# Altium integrated library Samtec 2 mm Pitch Terminal Strips.IntLib: 623 symbols (part 3 of 5) (continued)
## TSH-110-01-L-DH-SL (continued)

## TSH-110-01-L-DV-A
designator P?
Shrouded Header, Surface Mount, Vertical, -55 to 125 degC, 2 mm Pitch, 20-Pin, Male, RoHS; Manufacturer: Samtec; PartNumber: TSH-110-01-L-DV-A; Pitch: 2 mm; DatasheetVersion: F-214; PackageVersion: R, 7/2010; PackageReference: TSH-110-01-X-DV-A; PackageDescription: 2mm End Shroud Terminal Assembly; Supplier 1: Newark; Supplier Part Number 1: 77P3936; Orientation: Vertical; RoHS: True; Temperature Range: -55 to 125 degC; Mounting Technology: Surface Mount; ComponentLink1Description: Manufacturer URL; ComponentLink1URL: http://www.samtec.com; ComponentLink2Description: Datasheet; ComponentLink2URL: http://d2a072wq521u33.cloudfront.net/catalog_english//TSH.PDF; ComponentLink3Description: Package Specification; ComponentLink3URL: http://www.samtec.com/documents/webfiles/cpdf/TSH-1XX-XX-XX-DX-XX-MKT.pdf
footprint SMTC-TSH-110-01-X-DV-A (Shroud Terminal Assembly, 2x10 Pins, Vertical, 2mm Pitch, Male)
pins: 1, 2, 3, 4, 5, 6, 7, 8, 9, 10, 11, 12, 13, 14, 15, 16, 17, 18, 19, 20

## TSH-110-01-T-DH-SL
designator P?
Shrouded Header, Surface Mount, Horizontal, -55 to 105 degC, 2 mm Pitch, 20-Pin, Male, RoHS; Manufacturer: Samtec; PartNumber: TSH-110-01-T-DH-SL; Pitch: 2 mm; DatasheetVersion: F-214; PackageVersion: W, 9/1999; PackageReference: TSH-110-01-X-DH-SL; PackageDescription: 2mm Horizontal Mount Terminal Strip Assembly; Supplier 1: Newark; Supplier Part Number 1: 77P3983; Orientation: Horizontal; RoHS: True; Temperature Range: -55 to 105 degC; Mounting Technology: Surface Mount; ComponentLink1Description: Manufacturer URL; ComponentLink1URL: http://www.samtec.com; ComponentLink2Description: Datasheet; ComponentLink2URL: http://d2a072wq521u33.cloudfront.net/catalog_english//TSH.PDF; ComponentLink3Description: Package Specification; ComponentLink3URL: http://www.samtec.com/documents/webfiles/cpdf/TSH-1XX-XX-XX-XX-XX-MKT.pdf
footprint SMTC-TSH-110-01-X-DH-SL (Terminal Strip Assembly, 2x10 Pins, Horizontal, 2mm Pitch, Male)
pins: 1, 2, 3, 4, 5, 6, 7, 8, 9, 10, 11, 12, 13, 14, 15, 16, 17, 18, 19, 20, MH1, MH2

## TSH-110-01-T-DV-A
designator P?
Shrouded Header, Surface Mount, Vertical, -55 to 105 degC, 2 mm Pitch, 20-Pin, Male, RoHS; Manufacturer: Samtec; PartNumber: TSH-110-01-T-DV-A; Pitch: 2 mm; DatasheetVersion: F-214; PackageVersion: R, 7/2010; PackageReference: TSH-110-01-X-DV-A; PackageDescription: 2mm End Shroud Terminal Assembly; Supplier 1: Newark; Supplier Part Number 1: 77P3986; Orientation: Vertical; RoHS: True; Temperature Range: -55 to 105 degC; Mounting Technology: Surface Mount; ComponentLink1Description: Manufacturer URL; ComponentLink1URL: http://www.samtec.com; ComponentLink2Description: Datasheet; ComponentLink2URL: http://d2a072wq521u33.cloudfront.net/catalog_english//TSH.PDF; ComponentLink3Description: Package Specification; ComponentLink3URL: http://www.samtec.com/documents/webfiles/cpdf/TSH-1XX-XX-XX-DX-XX-MKT.pdf
footprint SMTC-TSH-110-01-X-DV-A (Shroud Terminal Assembly, 2x10 Pins, Vertical, 2mm Pitch, Male)
pins: 1, 2, 3, 4, 5, 6, 7, 8, 9, 10, 11, 12, 13, 14, 15, 16, 17, 18, 19, 20

## TSH-120-01-F-DV-A-M
designator P?
Shrouded Header, Surface Mount, Vertical, -55 to 125 degC, 2 mm Pitch, 40-Pin, Male, RoHS; Manufacturer: Samtec; PartNumber: TSH-120-01-F-DV-A-M; Pitch: 2 mm; DatasheetVersion: F-214; PackageVersion: R, 7/2010; PackageReference: TSH-120-01-X-DV-A-M; PackageDescription: 2mm End Shroud Terminal Assembly; Orientation: Vertical; RoHS: True; Temperature Range: -55 to 125 degC; Mounting Technology: Surface Mount; ComponentLink1Description: Manufacturer URL; ComponentLink1URL: http://www.samtec.com; ComponentLink2Description: Datasheet; ComponentLink2URL: http://d2a072wq521u33.cloudfront.net/catalog_english//TSH.PDF; ComponentLink3Description: Package Specification; ComponentLink3URL: http://www.samtec.com/documents/webfiles/cpdf/TSH-1XX-XX-XX-DX-XX-MKT.pdf
footprint SMTC-TSH-120-01-X-DV-A-M (Shroud Terminal Assembly, 2x20 Pins, Vertical, 2mm Pitch, Male)
pins: 1, 2, 3, 4, 5, 6, 7, 8, 9, 10, 11, 12, 13, 14, 15, 16, 17, 18, 19, 20, 21, 22, 23, 24, 25, 26, 27, 28, 29, 30, 31, 32, 33, 34, 35, 36, 37, 38, 39, 40

## TSH-120-01-L-DV-A-M
designator P?
Shrouded Header, Surface Mount, Vertical, -55 to 125 degC, 2 mm Pitch, 40-Pin, Male, RoHS; Manufacturer: Samtec; PartNumber: TSH-120-01-L-DV-A-M; Pitch: 2 mm; DatasheetVersion: F-214; PackageVersion: R, 7/2010; PackageReference: TSH-120-01-X-DV-A-M; PackageDescription: 2mm End Shroud Terminal Assembly; Orientation: Vertical; RoHS: True; Temperature Range: -55 to 125 degC; Mounting Technology: Surface Mount; ComponentLink1Description: Manufacturer URL; ComponentLink1URL: http://www.samtec.com; ComponentLink2Description: Datasheet; ComponentLink2URL: http://d2a072wq521u33.cloudfront.net/catalog_english//TSH.PDF; ComponentLink3Description: Package Specification; ComponentLink3URL: http://www.samtec.com/documents/webfiles/cpdf/TSH-1XX-XX-XX-DX-XX-MKT.pdf
footprint SMTC-TSH-120-01-X-DV-A-M (Shroud Terminal Assembly, 2x20 Pins, Vertical, 2mm Pitch, Male)
pins: 1, 2, 3, 4, 5, 6, 7, 8, 9, 10, 11, 12, 13, 14, 15, 16, 17, 18, 19, 20, 21, 22, 23, 24, 25, 26, 27, 28, 29, 30, 31, 32, 33, 34, 35, 36, 37, 38, 39, 40

## TSH-120-01-T-DV-A-M
designator P?
Shrouded Header, Surface Mount, Vertical, -55 to 105 degC, 2 mm Pitch, 40-Pin, Male, RoHS; Manufacturer: Samtec; PartNumber: TSH-120-01-T-DV-A-M; Pitch: 2 mm; DatasheetVersion: F-214; PackageVersion: R, 7/2010; PackageReference: TSH-120-01-X-DV-A-M; PackageDescription: 2mm End Shroud Terminal Assembly; Orientation: Vertical; RoHS: True; Temperature Range: -55 to 105 degC; Mounting Technology: Surface Mount; ComponentLink1Description: Manufacturer URL; ComponentLink1URL: http://www.samtec.com; ComponentLink2Description: Datasheet; ComponentLink2URL: http://d2a072wq521u33.cloudfront.net/catalog_english//TSH.PDF; ComponentLink3Description: Package Specification; ComponentLink3URL: http://www.samtec.com/documents/webfiles/cpdf/TSH-1XX-XX-XX-DX-XX-MKT.pdf
footprint SMTC-TSH-120-01-X-DV-A-M (Shroud Terminal Assembly, 2x20 Pins, Vertical, 2mm Pitch, Male)
pins: 1, 2, 3, 4, 5, 6, 7, 8, 9, 10, 11, 12, 13, 14, 15, 16, 17, 18, 19, 20, 21, 22, 23, 24, 25, 26, 27, 28, 29, 30, 31, 32, 33, 34, 35, 36, 37, 38, 39, 40

## TSH-130-01-F-DH-SL
designator P?
Shrouded Header, Surface Mount, Horizontal, -55 to 125 degC, 2 mm Pitch, 60-Pin, Male, RoHS; Manufacturer: Samtec; PartNumber: TSH-130-01-F-DH-SL; Pitch: 2 mm; DatasheetVersion: F-214; PackageVersion: W, 9/1999; PackageReference: TSH-130-01-X-DH-SL; PackageDescription: 2mm Horizontal Mount Terminal Strip Assembly; Supplier 1: Newark; Supplier Part Number 1: 77P4351; Orientation: Horizontal; RoHS: True; Temperature Range: -55 to 125 degC; Mounting Technology: Surface Mount; ComponentLink1Description: Manufacturer URL; ComponentLink1URL: http://www.samtec.com; ComponentLink2Description: Datasheet; ComponentLink2URL: http://d2a072wq521u33.cloudfront.net/catalog_english//TSH.PDF; ComponentLink3Description: Package Specification; ComponentLink3URL: http://www.samtec.com/documents/webfiles/cpdf/TSH-1XX-XX-XX-XX-XX-MKT.pdf
footprint SMTC-TSH-130-01-X-DH-SL (Terminal Strip Assembly, 2x30 Pins, Horizontal, 2mm Pitch, Male)
pins: 1, 2, 3, 4, 5, 6, 7, 8, 9, 10, 11, 12, 13, 14, 15, 16, 17, 18, 19, 20, 21, 22, 23, 24, 25, 26, 27, 28, 29, 30, 31, 32, 33, 34, 35, 36, 37, 38, 39, 40, 41, 42, 43, 44, 45, 46, 47, 48, 49, 50, 51, 52, 53, 54, 55, 56, 57, 58, 59, 60, MH1, MH2

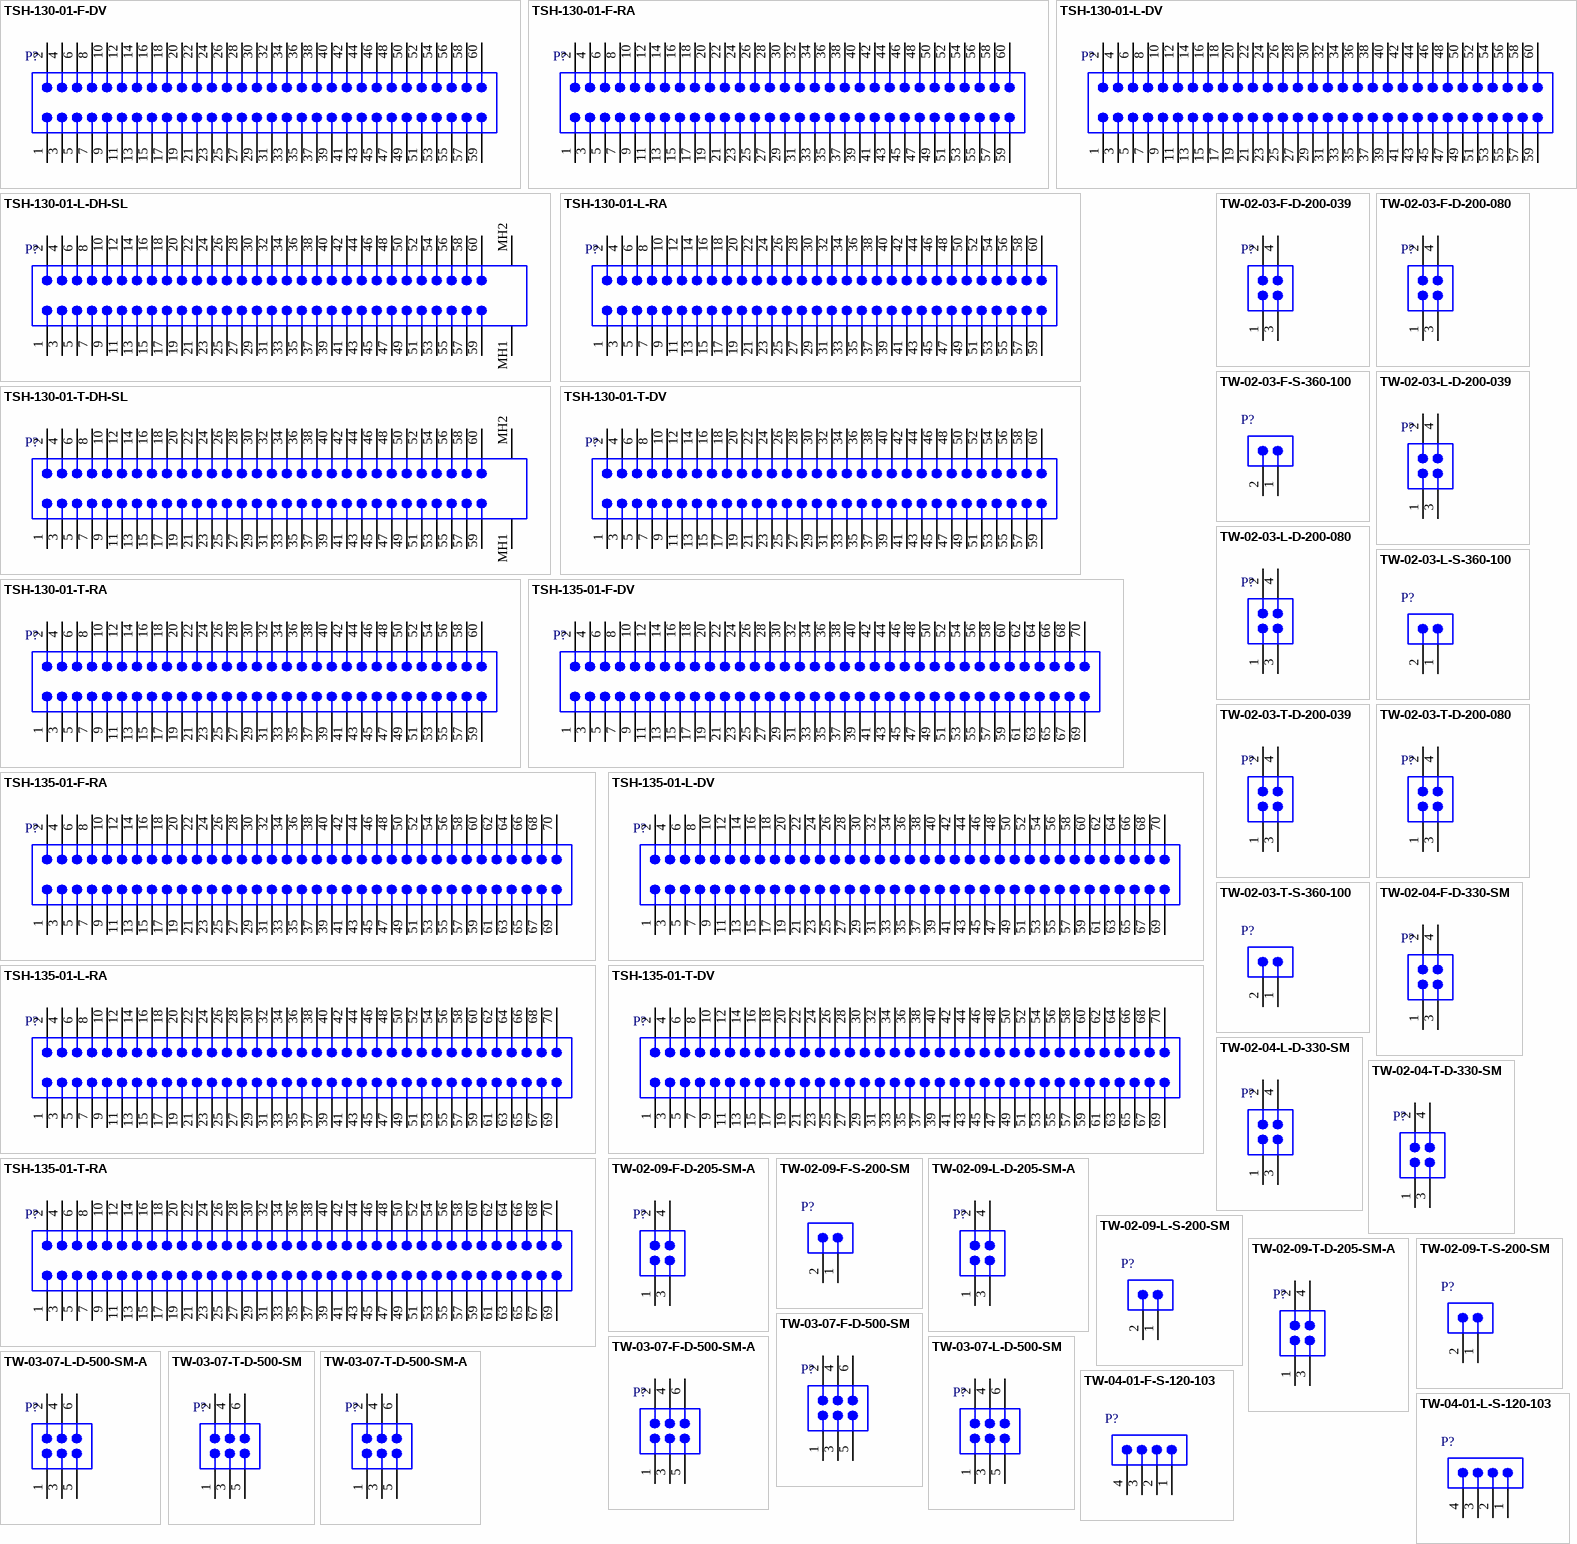
[diagram p9: symbols TSH-130-01-F-DV to TW-04-01-L-S-120-103]

## TSH-130-01-F-DV
designator P?
Shrouded Header, Surface Mount, Vertical, -55 to 125 degC, 2 mm Pitch, 60-Pin, Male, RoHS; Manufacturer: Samtec; PartNumber: TSH-130-01-F-DV; Pitch: 2 mm; DatasheetVersion: F-214; PackageVersion: R, 7/2010; PackageReference: TSH-130-01-X-DV; PackageDescription: 2mm End Shroud Terminal Assembly; Supplier 1: Newark; Supplier Part Number 1: 77P4353; Orientation: Vertical; RoHS: True; Temperature Range: -55 to 125 degC; Mounting Technology: Surface Mount; ComponentLink1Description: Manufacturer URL; ComponentLink1URL: http://www.samtec.com; ComponentLink2Description: Datasheet; ComponentLink2URL: http://d2a072wq521u33.cloudfront.net/catalog_english//TSH.PDF; ComponentLink3Description: Package Specification; ComponentLink3URL: http://www.samtec.com/documents/webfiles/cpdf/TSH-1XX-XX-XX-DX-XX-MKT.pdf
footprint SMTC-TSH-130-01-X-DV (Shroud Terminal Assembly, 2x30 Pins, Vertical, 2mm Pitch, Male)
pins: 1, 2, 3, 4, 5, 6, 7, 8, 9, 10, 11, 12, 13, 14, 15, 16, 17, 18, 19, 20, 21, 22, 23, 24, 25, 26, 27, 28, 29, 30, 31, 32, 33, 34, 35, 36, 37, 38, 39, 40, 41, 42, 43, 44, 45, 46, 47, 48, 49, 50, 51, 52, 53, 54, 55, 56, 57, 58, 59, 60

## TSH-130-01-F-RA
designator P?
Shrouded Header, Through-Hole, Right Angle, -55 to 125 degC, 2 mm Pitch, 60-Pin, Male, RoHS; Manufacturer: Samtec; PartNumber: TSH-130-01-F-RA; Pitch: 2 mm; DatasheetVersion: F-214; PackageVersion: W, 9/1999; PackageReference: TSH-130-01-X-RA; PackageDescription: 2mm Horizontal Mount Terminal Strip Assembly; Supplier 1: Newark; Supplier Part Number 1: 77P4357; Orientation: Right Angle; RoHS: True; Temperature Range: -55 to 125 degC; Mounting Technology: Through-hole; ComponentLink1Description: Manufacturer URL; ComponentLink1URL: http://www.samtec.com; ComponentLink2Description: Datasheet; ComponentLink2URL: http://d2a072wq521u33.cloudfront.net/catalog_english//TSH.PDF; ComponentLink3Description: Package Specification; ComponentLink3URL: http://www.samtec.com/documents/webfiles/cpdf/TSH-1XX-XX-XX-XX-XX-MKT.pdf
footprint SMTC-TSH-130-01-X-RA (Terminal Strip Assembly, 2x30 Pins, Right Angle, 2mm Pitch, Male)
pins: 1, 2, 3, 4, 5, 6, 7, 8, 9, 10, 11, 12, 13, 14, 15, 16, 17, 18, 19, 20, 21, 22, 23, 24, 25, 26, 27, 28, 29, 30, 31, 32, 33, 34, 35, 36, 37, 38, 39, 40, 41, 42, 43, 44, 45, 46, 47, 48, 49, 50, 51, 52, 53, 54, 55, 56, 57, 58, 59, 60

## TSH-130-01-L-DH-SL
designator P?
Shrouded Header, Surface Mount, Horizontal, -55 to 125 degC, 2 mm Pitch, 60-Pin, Male, RoHS; Manufacturer: Samtec; PartNumber: TSH-130-01-L-DH-SL; Pitch: 2 mm; DatasheetVersion: F-214; PackageVersion: W, 9/1999; PackageReference: TSH-130-01-X-DH-SL; PackageDescription: 2mm Horizontal Mount Terminal Strip Assembly; Supplier 1: Newark; Supplier Part Number 1: 77P4362; Orientation: Horizontal; RoHS: True; Temperature Range: -55 to 125 degC; Mounting Technology: Surface Mount; ComponentLink1Description: Manufacturer URL; ComponentLink1URL: http://www.samtec.com; ComponentLink2Description: Datasheet; ComponentLink2URL: http://d2a072wq521u33.cloudfront.net/catalog_english//TSH.PDF; ComponentLink3Description: Package Specification; ComponentLink3URL: http://www.samtec.com/documents/webfiles/cpdf/TSH-1XX-XX-XX-XX-XX-MKT.pdf
footprint SMTC-TSH-130-01-X-DH-SL (Terminal Strip Assembly, 2x30 Pins, Horizontal, 2mm Pitch, Male)
pins: 1, 2, 3, 4, 5, 6, 7, 8, 9, 10, 11, 12, 13, 14, 15, 16, 17, 18, 19, 20, 21, 22, 23, 24, 25, 26, 27, 28, 29, 30, 31, 32, 33, 34, 35, 36, 37, 38, 39, 40, 41, 42, 43, 44, 45, 46, 47, 48, 49, 50, 51, 52, 53, 54, 55, 56, 57, 58, 59, 60, MH1, MH2

## TSH-130-01-L-DV
designator P?
Shrouded Header, Surface Mount, Vertical, -55 to 125 degC, 2 mm Pitch, 60-Pin, Male, RoHS; Manufacturer: Samtec; PartNumber: TSH-130-01-L-DV; Pitch: 2 mm; DatasheetVersion: F-214; PackageVersion: R, 7/2010; PackageReference: TSH-130-01-X-DV; PackageDescription: 2mm End Shroud Terminal Assembly; Supplier 1: Newark; Supplier Part Number 1: 77P4364; Orientation: Vertical; RoHS: True; Temperature Range: -55 to 125 degC; Mounting Technology: Surface Mount; ComponentLink1Description: Manufacturer URL; ComponentLink1URL: http://www.samtec.com; ComponentLink2Description: Datasheet; ComponentLink2URL: http://d2a072wq521u33.cloudfront.net/catalog_english//TSH.PDF; ComponentLink3Description: Package Specification; ComponentLink3URL: http://www.samtec.com/documents/webfiles/cpdf/TSH-1XX-XX-XX-DX-XX-MKT.pdf
footprint SMTC-TSH-130-01-X-DV (Shroud Terminal Assembly, 2x30 Pins, Vertical, 2mm Pitch, Male)
pins: 1, 2, 3, 4, 5, 6, 7, 8, 9, 10, 11, 12, 13, 14, 15, 16, 17, 18, 19, 20, 21, 22, 23, 24, 25, 26, 27, 28, 29, 30, 31, 32, 33, 34, 35, 36, 37, 38, 39, 40, 41, 42, 43, 44, 45, 46, 47, 48, 49, 50, 51, 52, 53, 54, 55, 56, 57, 58, 59, 60

## TSH-130-01-L-RA
designator P?
Shrouded Header, Through-Hole, Right Angle, -55 to 125 degC, 2 mm Pitch, 60-Pin, Male, RoHS; Manufacturer: Samtec; PartNumber: TSH-130-01-L-RA; Pitch: 2 mm; DatasheetVersion: F-214; PackageVersion: W, 9/1999; PackageReference: TSH-130-01-X-RA; PackageDescription: 2mm Horizontal Mount Terminal Strip Assembly; Supplier 1: Newark; Supplier Part Number 1: 77P4367; Orientation: Right Angle; RoHS: True; Temperature Range: -55 to 125 degC; Mounting Technology: Through-hole; ComponentLink1Description: Manufacturer URL; ComponentLink1URL: http://www.samtec.com; ComponentLink2Description: Datasheet; ComponentLink2URL: http://d2a072wq521u33.cloudfront.net/catalog_english//TSH.PDF; ComponentLink3Description: Package Specification; ComponentLink3URL: http://www.samtec.com/documents/webfiles/cpdf/TSH-1XX-XX-XX-XX-XX-MKT.pdf
footprint SMTC-TSH-130-01-X-RA (Terminal Strip Assembly, 2x30 Pins, Right Angle, 2mm Pitch, Male)
pins: 1, 2, 3, 4, 5, 6, 7, 8, 9, 10, 11, 12, 13, 14, 15, 16, 17, 18, 19, 20, 21, 22, 23, 24, 25, 26, 27, 28, 29, 30, 31, 32, 33, 34, 35, 36, 37, 38, 39, 40, 41, 42, 43, 44, 45, 46, 47, 48, 49, 50, 51, 52, 53, 54, 55, 56, 57, 58, 59, 60

## TSH-130-01-T-DH-SL
designator P?
Shrouded Header, Surface Mount, Horizontal, -55 to 105 degC, 2 mm Pitch, 60-Pin, Male, RoHS; Manufacturer: Samtec; PartNumber: TSH-130-01-T-DH-SL; Pitch: 2 mm; DatasheetVersion: F-214; PackageVersion: W, 9/1999; PackageReference: TSH-130-01-X-DH-SL; PackageDescription: 2mm Horizontal Mount Terminal Strip Assembly; Supplier 1: Newark; Supplier Part Number 1: 77P4379; Orientation: Horizontal; RoHS: True; Temperature Range: -55 to 105 degC; Mounting Technology: Surface Mount; ComponentLink1Description: Manufacturer URL; ComponentLink1URL: http://www.samtec.com; ComponentLink2Description: Datasheet; ComponentLink2URL: http://d2a072wq521u33.cloudfront.net/catalog_english//TSH.PDF; ComponentLink3Description: Package Specification; ComponentLink3URL: http://www.samtec.com/documents/webfiles/cpdf/TSH-1XX-XX-XX-XX-XX-MKT.pdf
footprint SMTC-TSH-130-01-X-DH-SL (Terminal Strip Assembly, 2x30 Pins, Horizontal, 2mm Pitch, Male)
pins: 1, 2, 3, 4, 5, 6, 7, 8, 9, 10, 11, 12, 13, 14, 15, 16, 17, 18, 19, 20, 21, 22, 23, 24, 25, 26, 27, 28, 29, 30, 31, 32, 33, 34, 35, 36, 37, 38, 39, 40, 41, 42, 43, 44, 45, 46, 47, 48, 49, 50, 51, 52, 53, 54, 55, 56, 57, 58, 59, 60, MH1, MH2

## TSH-130-01-T-DV
designator P?
Shrouded Header, Surface Mount, Vertical, -55 to 105 degC, 2 mm Pitch, 60-Pin, Male, RoHS; Manufacturer: Samtec; PartNumber: TSH-130-01-T-DV; Pitch: 2 mm; DatasheetVersion: F-214; PackageVersion: R, 7/2010; PackageReference: TSH-130-01-X-DV; PackageDescription: 2mm End Shroud Terminal Assembly; Orientation: Vertical; RoHS: True; Temperature Range: -55 to 105 degC; Mounting Technology: Surface Mount; ComponentLink1Description: Manufacturer URL; ComponentLink1URL: http://www.samtec.com; ComponentLink2Description: Datasheet; ComponentLink2URL: http://d2a072wq521u33.cloudfront.net/catalog_english//TSH.PDF; ComponentLink3Description: Package Specification; ComponentLink3URL: http://www.samtec.com/documents/webfiles/cpdf/TSH-1XX-XX-XX-DX-XX-MKT.pdf
footprint SMTC-TSH-130-01-X-DV (Shroud Terminal Assembly, 2x30 Pins, Vertical, 2mm Pitch, Male)
pins: 1, 2, 3, 4, 5, 6, 7, 8, 9, 10, 11, 12, 13, 14, 15, 16, 17, 18, 19, 20, 21, 22, 23, 24, 25, 26, 27, 28, 29, 30, 31, 32, 33, 34, 35, 36, 37, 38, 39, 40, 41, 42, 43, 44, 45, 46, 47, 48, 49, 50, 51, 52, 53, 54, 55, 56, 57, 58, 59, 60

## TSH-130-01-T-RA
designator P?
Shrouded Header, Through-Hole, Right Angle, -55 to 105 degC, 2 mm Pitch, 60-Pin, Male, RoHS; Manufacturer: Samtec; PartNumber: TSH-130-01-T-RA; Pitch: 2 mm; DatasheetVersion: F-214; PackageVersion: W, 9/1999; PackageReference: TSH-130-01-X-RA; PackageDescription: 2mm Horizontal Mount Terminal Strip Assembly; Supplier 1: Newark; Supplier Part Number 1: 77P4383; Orientation: Right Angle; RoHS: True; Temperature Range: -55 to 105 degC; Mounting Technology: Through-hole; ComponentLink1Description: Manufacturer URL; ComponentLink1URL: http://www.samtec.com; ComponentLink2Description: Datasheet; ComponentLink2URL: http://d2a072wq521u33.cloudfront.net/catalog_english//TSH.PDF; ComponentLink3Description: Package Specification; ComponentLink3URL: http://www.samtec.com/documents/webfiles/cpdf/TSH-1XX-XX-XX-XX-XX-MKT.pdf
footprint SMTC-TSH-130-01-X-RA (Terminal Strip Assembly, 2x30 Pins, Right Angle, 2mm Pitch, Male)
pins: 1, 2, 3, 4, 5, 6, 7, 8, 9, 10, 11, 12, 13, 14, 15, 16, 17, 18, 19, 20, 21, 22, 23, 24, 25, 26, 27, 28, 29, 30, 31, 32, 33, 34, 35, 36, 37, 38, 39, 40, 41, 42, 43, 44, 45, 46, 47, 48, 49, 50, 51, 52, 53, 54, 55, 56, 57, 58, 59, 60

## TSH-135-01-F-DV
designator P?
Shrouded Header, Surface Mount, Vertical, -55 to 125 degC, 2 mm Pitch, 70-Pin, Male, RoHS; Manufacturer: Samtec; PartNumber: TSH-135-01-F-DV; Pitch: 2 mm; DatasheetVersion: F-214; PackageVersion: R, 7/2010; PackageReference: TSH-135-01-X-DV; PackageDescription: 2mm End Shroud Terminal Assembly; Orientation: Vertical; RoHS: True; Temperature Range: -55 to 125 degC; Mounting Technology: Surface Mount; ComponentLink1Description: Manufacturer URL; ComponentLink1URL: http://www.samtec.com; ComponentLink2Description: Datasheet; ComponentLink2URL: http://d2a072wq521u33.cloudfront.net/catalog_english//TSH.PDF; ComponentLink3Description: Package Specification; ComponentLink3URL: http://www.samtec.com/documents/webfiles/cpdf/TSH-1XX-XX-XX-DX-XX-MKT.pdf
footprint SMTC-TSH-135-01-X-DV (Shroud Terminal Assembly, 2x35 Pins, Vertical, 2mm Pitch, Male)
pins: 1, 2, 3, 4, 5, 6, 7, 8, 9, 10, 11, 12, 13, 14, 15, 16, 17, 18, 19, 20, 21, 22, 23, 24, 25, 26, 27, 28, 29, 30, 31, 32, 33, 34, 35, 36, 37, 38, 39, 40, 41, 42, 43, 44, 45, 46, 47, 48, 49, 50, 51, 52, 53, 54, 55, 56, 57, 58, 59, 60, 61, 62, 63, 64, 65, 66, 67, 68, 69, 70

## TSH-135-01-F-RA
designator P?
Shrouded Header, Through-Hole, Right Angle, -55 to 125 degC, 2 mm Pitch, 70-Pin, Male, RoHS; Manufacturer: Samtec; PartNumber: TSH-135-01-F-RA; Pitch: 2 mm; DatasheetVersion: F-214; PackageVersion: W, 9/1999; PackageReference: TSH-135-01-X-RA; PackageDescription: 2mm Horizontal Mount Terminal Strip Assembly; Supplier 1: Newark; Supplier Part Number 1: 77P4395; Orientation: Right Angle; RoHS: True; Temperature Range: -55 to 125 degC; Mounting Technology: Through-hole; ComponentLink1Description: Manufacturer URL; ComponentLink1URL: http://www.samtec.com; ComponentLink2Description: Datasheet; ComponentLink2URL: http://d2a072wq521u33.cloudfront.net/catalog_english//TSH.PDF; ComponentLink3Description: Package Specification; ComponentLink3URL: http://www.samtec.com/documents/webfiles/cpdf/TSH-1XX-XX-XX-XX-XX-MKT.pdf
footprint SMTC-TSH-135-01-X-RA (Terminal Strip Assembly, 2x35 Pins, Right Angle, 2mm Pitch, Male)
pins: 1, 2, 3, 4, 5, 6, 7, 8, 9, 10, 11, 12, 13, 14, 15, 16, 17, 18, 19, 20, 21, 22, 23, 24, 25, 26, 27, 28, 29, 30, 31, 32, 33, 34, 35, 36, 37, 38, 39, 40, 41, 42, 43, 44, 45, 46, 47, 48, 49, 50, 51, 52, 53, 54, 55, 56, 57, 58, 59, 60, 61, 62, 63, 64, 65, 66, 67, 68, 69, 70

## TSH-135-01-L-DV
designator P?
Shrouded Header, Surface Mount, Vertical, -55 to 125 degC, 2 mm Pitch, 70-Pin, Male, RoHS; Manufacturer: Samtec; PartNumber: TSH-135-01-L-DV; Pitch: 2 mm; DatasheetVersion: F-214; PackageVersion: R, 7/2010; PackageReference: TSH-135-01-X-DV; PackageDescription: 2mm End Shroud Terminal Assembly; Supplier 1: Newark; Supplier Part Number 1: 77P4400; Orientation: Vertical; RoHS: True; Temperature Range: -55 to 125 degC; Mounting Technology: Surface Mount; ComponentLink1Description: Manufacturer URL; ComponentLink1URL: http://www.samtec.com; ComponentLink2Description: Datasheet; ComponentLink2URL: http://d2a072wq521u33.cloudfront.net/catalog_english//TSH.PDF; ComponentLink3Description: Package Specification; ComponentLink3URL: http://www.samtec.com/documents/webfiles/cpdf/TSH-1XX-XX-XX-DX-XX-MKT.pdf
footprint SMTC-TSH-135-01-X-DV (Shroud Terminal Assembly, 2x35 Pins, Vertical, 2mm Pitch, Male)
pins: 1, 2, 3, 4, 5, 6, 7, 8, 9, 10, 11, 12, 13, 14, 15, 16, 17, 18, 19, 20, 21, 22, 23, 24, 25, 26, 27, 28, 29, 30, 31, 32, 33, 34, 35, 36, 37, 38, 39, 40, 41, 42, 43, 44, 45, 46, 47, 48, 49, 50, 51, 52, 53, 54, 55, 56, 57, 58, 59, 60, 61, 62, 63, 64, 65, 66, 67, 68, 69, 70

## TSH-135-01-L-RA
designator P?
Shrouded Header, Through-Hole, Right Angle, -55 to 125 degC, 2 mm Pitch, 70-Pin, Male, RoHS; Manufacturer: Samtec; PartNumber: TSH-135-01-L-RA; Pitch: 2 mm; DatasheetVersion: F-214; PackageVersion: W, 9/1999; PackageReference: TSH-135-01-X-RA; PackageDescription: 2mm Horizontal Mount Terminal Strip Assembly; Supplier 1: Newark; Supplier Part Number 1: 77P4402; Orientation: Right Angle; RoHS: True; Temperature Range: -55 to 125 degC; Mounting Technology: Through-hole; ComponentLink1Description: Manufacturer URL; ComponentLink1URL: http://www.samtec.com; ComponentLink2Description: Datasheet; ComponentLink2URL: http://d2a072wq521u33.cloudfront.net/catalog_english//TSH.PDF; ComponentLink3Description: Package Specification; ComponentLink3URL: http://www.samtec.com/documents/webfiles/cpdf/TSH-1XX-XX-XX-XX-XX-MKT.pdf
footprint SMTC-TSH-135-01-X-RA (Terminal Strip Assembly, 2x35 Pins, Right Angle, 2mm Pitch, Male)
pins: 1, 2, 3, 4, 5, 6, 7, 8, 9, 10, 11, 12, 13, 14, 15, 16, 17, 18, 19, 20, 21, 22, 23, 24, 25, 26, 27, 28, 29, 30, 31, 32, 33, 34, 35, 36, 37, 38, 39, 40, 41, 42, 43, 44, 45, 46, 47, 48, 49, 50, 51, 52, 53, 54, 55, 56, 57, 58, 59, 60, 61, 62, 63, 64, 65, 66, 67, 68, 69, 70

## TSH-135-01-T-DV
designator P?
Shrouded Header, Surface Mount, Vertical, -55 to 105 degC, 2 mm Pitch, 70-Pin, Male, RoHS; Manufacturer: Samtec; PartNumber: TSH-135-01-T-DV; Pitch: 2 mm; DatasheetVersion: F-214; PackageVersion: R, 7/2010; PackageReference: TSH-135-01-X-DV; PackageDescription: 2mm End Shroud Terminal Assembly; Orientation: Vertical; RoHS: True; Temperature Range: -55 to 105 degC; Mounting Technology: Surface Mount; ComponentLink1Description: Manufacturer URL; ComponentLink1URL: http://www.samtec.com; ComponentLink2Description: Datasheet; ComponentLink2URL: http://d2a072wq521u33.cloudfront.net/catalog_english//TSH.PDF; ComponentLink3Description: Package Specification; ComponentLink3URL: http://www.samtec.com/documents/webfiles/cpdf/TSH-1XX-XX-XX-DX-XX-MKT.pdf
footprint SMTC-TSH-135-01-X-DV (Shroud Terminal Assembly, 2x35 Pins, Vertical, 2mm Pitch, Male)
pins: 1, 2, 3, 4, 5, 6, 7, 8, 9, 10, 11, 12, 13, 14, 15, 16, 17, 18, 19, 20, 21, 22, 23, 24, 25, 26, 27, 28, 29, 30, 31, 32, 33, 34, 35, 36, 37, 38, 39, 40, 41, 42, 43, 44, 45, 46, 47, 48, 49, 50, 51, 52, 53, 54, 55, 56, 57, 58, 59, 60, 61, 62, 63, 64, 65, 66, 67, 68, 69, 70

## TSH-135-01-T-RA
designator P?
Shrouded Header, Through-Hole, Right Angle, -55 to 105 degC, 2 mm Pitch, 70-Pin, Male, RoHS; Manufacturer: Samtec; PartNumber: TSH-135-01-T-RA; Pitch: 2 mm; DatasheetVersion: F-214; PackageVersion: W, 9/1999; PackageReference: TSH-135-01-X-RA; PackageDescription: 2mm Horizontal Mount Terminal Strip Assembly; Supplier 1: Newark; Supplier Part Number 1: 77P4414; Orientation: Right Angle; RoHS: True; Temperature Range: -55 to 105 degC; Mounting Technology: Through-hole; ComponentLink1Description: Manufacturer URL; ComponentLink1URL: http://www.samtec.com; ComponentLink2Description: Datasheet; ComponentLink2URL: http://d2a072wq521u33.cloudfront.net/catalog_english//TSH.PDF; ComponentLink3Description: Package Specification; ComponentLink3URL: http://www.samtec.com/documents/webfiles/cpdf/TSH-1XX-XX-XX-XX-XX-MKT.pdf
footprint SMTC-TSH-135-01-X-RA (Terminal Strip Assembly, 2x35 Pins, Right Angle, 2mm Pitch, Male)
pins: 1, 2, 3, 4, 5, 6, 7, 8, 9, 10, 11, 12, 13, 14, 15, 16, 17, 18, 19, 20, 21, 22, 23, 24, 25, 26, 27, 28, 29, 30, 31, 32, 33, 34, 35, 36, 37, 38, 39, 40, 41, 42, 43, 44, 45, 46, 47, 48, 49, 50, 51, 52, 53, 54, 55, 56, 57, 58, 59, 60, 61, 62, 63, 64, 65, 66, 67, 68, 69, 70

## TW-02-03-F-D-200-039
designator P?
Through-Hole Board Stacker, Vertical, -55 to 125 degC, 2 mm Pitch, 4-Pin, Male, RoHS; Manufacturer: Samtec; PartNumber: TW-02-03-F-D-200-039; Pitch: 2 mm; DatasheetVersion: F-214; PackageVersion: BF, 6/1998; PackageReference: TW-02-03-X-D-200-039; PackageDescription: High Temp 2mm Terminal Strip(Board Stacking); Orientation: Vertical; RoHS: True; Temperature Range: -55 to 125 degC; Mounting Technology: Through-hole; ComponentLink1Description: Manufacturer URL; ComponentLink1URL: http://www.samtec.com; ComponentLink2Description: Datasheet; ComponentLink2URL: http://d2a072wq521u33.cloudfront.net/catalog_english//TW_TH.PDF; ComponentLink3Description: Package Specification; ComponentLink3URL: http://www.samtec.com/documents/webfiles/cpdf/TW-XX-XX-X-X-XXX-XXX-XXX-XX-MKT2.pdf
footprint SMTC-TW-02-03-X-D-200-039 (Terminal Strip, 2x2 Pins, Vertical, 2mm Pitch, Male)
pins: 1, 2, 3, 4

## TW-02-03-F-D-200-080
designator P?
Through-Hole Board Stacker, Vertical, -55 to 125 degC, 2 mm Pitch, 4-Pin, Male, RoHS; Manufacturer: Samtec; PartNumber: TW-02-03-F-D-200-080; Pitch: 2 mm; DatasheetVersion: F-214; PackageVersion: BF, 6/1998; PackageReference: TW-02-03-X-D-200-080; PackageDescription: High Temp 2mm Terminal Strip(Board Stacking); Orientation: Vertical; RoHS: True; Temperature Range: -55 to 125 degC; Mounting Technology: Through-hole; ComponentLink1Description: Manufacturer URL; ComponentLink1URL: http://www.samtec.com; ComponentLink2Description: Datasheet; ComponentLink2URL: http://d2a072wq521u33.cloudfront.net/catalog_english//TW_TH.PDF; ComponentLink3Description: Package Specification; ComponentLink3URL: http://www.samtec.com/documents/webfiles/cpdf/TW-XX-XX-X-X-XXX-XXX-XXX-XX-MKT2.pdf
footprint SMTC-TW-02-03-X-D-200-080 (Terminal Strip, 2x2 Pins, Vertical, 2mm Pitch, Male)
pins: 1, 2, 3, 4

## TW-02-03-F-S-360-100
designator P?
Through-Hole Board Stacker, Vertical, -55 to 125 degC, 2 mm Pitch, 2-Pin, Male, RoHS; Manufacturer: Samtec; PartNumber: TW-02-03-F-S-360-100; Pitch: 2 mm; DatasheetVersion: F-214; PackageVersion: BF, 6/1998; PackageReference: TW-02-03-X-S-360-100; PackageDescription: High Temp 2mm Terminal Strip(Board Stacking); Orientation: Vertical; RoHS: True; Temperature Range: -55 to 125 degC; Mounting Technology: Through-hole; ComponentLink1Description: Manufacturer URL; ComponentLink1URL: http://www.samtec.com; ComponentLink2Description: Datasheet; ComponentLink2URL: http://d2a072wq521u33.cloudfront.net/catalog_english//TW_TH.PDF; ComponentLink3Description: Package Specification; ComponentLink3URL: http://www.samtec.com/documents/webfiles/cpdf/TW-XX-XX-X-X-XXX-XXX-XXX-XX-MKT2.pdf
footprint SMTC-TW-02-03-X-S-360-100 (Terminal Strip, 1x2 Pins, Vertical, 2mm Pitch, Male)
pins: 1, 2

## TW-02-03-L-D-200-039
designator P?
Through-Hole Board Stacker, Vertical, -55 to 125 degC, 2 mm Pitch, 4-Pin, Male, RoHS; Manufacturer: Samtec; PartNumber: TW-02-03-L-D-200-039; Pitch: 2 mm; DatasheetVersion: F-214; PackageVersion: BF, 6/1998; PackageReference: TW-02-03-X-D-200-039; PackageDescription: High Temp 2mm Terminal Strip(Board Stacking); Orientation: Vertical; RoHS: True; Temperature Range: -55 to 125 degC; Mounting Technology: Through-hole; ComponentLink1Description: Manufacturer URL; ComponentLink1URL: http://www.samtec.com; ComponentLink2Description: Datasheet; ComponentLink2URL: http://d2a072wq521u33.cloudfront.net/catalog_english//TW_TH.PDF; ComponentLink3Description: Package Specification; ComponentLink3URL: http://www.samtec.com/documents/webfiles/cpdf/TW-XX-XX-X-X-XXX-XXX-XXX-XX-MKT2.pdf
footprint SMTC-TW-02-03-X-D-200-039 (Terminal Strip, 2x2 Pins, Vertical, 2mm Pitch, Male)
pins: 1, 2, 3, 4

## TW-02-03-L-D-200-080
designator P?
Through-Hole Board Stacker, Vertical, -55 to 125 degC, 2 mm Pitch, 4-Pin, Male, RoHS; Manufacturer: Samtec; PartNumber: TW-02-03-L-D-200-080; Pitch: 2 mm; DatasheetVersion: F-214; PackageVersion: BF, 6/1998; PackageReference: TW-02-03-X-D-200-080; PackageDescription: High Temp 2mm Terminal Strip(Board Stacking); Orientation: Vertical; RoHS: True; Temperature Range: -55 to 125 degC; Mounting Technology: Through-hole; ComponentLink1Description: Manufacturer URL; ComponentLink1URL: http://www.samtec.com; ComponentLink2Description: Datasheet; ComponentLink2URL: http://d2a072wq521u33.cloudfront.net/catalog_english//TW_TH.PDF; ComponentLink3Description: Package Specification; ComponentLink3URL: http://www.samtec.com/documents/webfiles/cpdf/TW-XX-XX-X-X-XXX-XXX-XXX-XX-MKT2.pdf
footprint SMTC-TW-02-03-X-D-200-080 (Terminal Strip, 2x2 Pins, Vertical, 2mm Pitch, Male)
pins: 1, 2, 3, 4

## TW-02-03-L-S-360-100
designator P?
Through-Hole Board Stacker, Vertical, -55 to 125 degC, 2 mm Pitch, 2-Pin, Male, RoHS; Manufacturer: Samtec; PartNumber: TW-02-03-L-S-360-100; Pitch: 2 mm; DatasheetVersion: F-214; PackageVersion: BF, 6/1998; PackageReference: TW-02-03-X-S-360-100; PackageDescription: High Temp 2mm Terminal Strip(Board Stacking); Orientation: Vertical; RoHS: True; Temperature Range: -55 to 125 degC; Mounting Technology: Through-hole; ComponentLink1Description: Manufacturer URL; ComponentLink1URL: http://www.samtec.com; ComponentLink2Description: Datasheet; ComponentLink2URL: http://d2a072wq521u33.cloudfront.net/catalog_english//TW_TH.PDF; ComponentLink3Description: Package Specification; ComponentLink3URL: http://www.samtec.com/documents/webfiles/cpdf/TW-XX-XX-X-X-XXX-XXX-XXX-XX-MKT2.pdf
footprint SMTC-TW-02-03-X-S-360-100 (Terminal Strip, 1x2 Pins, Vertical, 2mm Pitch, Male)
pins: 1, 2

## TW-02-03-T-D-200-039
designator P?
Through-Hole Board Stacker, Vertical, -55 to 105 degC, 2 mm Pitch, 4-Pin, Male, RoHS; Manufacturer: Samtec; PartNumber: TW-02-03-T-D-200-039; Pitch: 2 mm; DatasheetVersion: F-214; PackageVersion: BF, 6/1998; PackageReference: TW-02-03-X-D-200-039; PackageDescription: High Temp 2mm Terminal Strip(Board Stacking); Orientation: Vertical; RoHS: True; Temperature Range: -55 to 105 degC; Mounting Technology: Through-hole; ComponentLink1Description: Manufacturer URL; ComponentLink1URL: http://www.samtec.com; ComponentLink2Description: Datasheet; ComponentLink2URL: http://d2a072wq521u33.cloudfront.net/catalog_english//TW_TH.PDF; ComponentLink3Description: Package Specification; ComponentLink3URL: http://www.samtec.com/documents/webfiles/cpdf/TW-XX-XX-X-X-XXX-XXX-XXX-XX-MKT2.pdf
footprint SMTC-TW-02-03-X-D-200-039 (Terminal Strip, 2x2 Pins, Vertical, 2mm Pitch, Male)
pins: 1, 2, 3, 4

## TW-02-03-T-D-200-080
designator P?
Through-Hole Board Stacker, Vertical, -55 to 105 degC, 2 mm Pitch, 4-Pin, Male, RoHS; Manufacturer: Samtec; PartNumber: TW-02-03-T-D-200-080; Pitch: 2 mm; DatasheetVersion: F-214; PackageVersion: BF, 6/1998; PackageReference: TW-02-03-X-D-200-080; PackageDescription: High Temp 2mm Terminal Strip(Board Stacking); Orientation: Vertical; RoHS: True; Temperature Range: -55 to 105 degC; Mounting Technology: Through-hole; ComponentLink1Description: Manufacturer URL; ComponentLink1URL: http://www.samtec.com; ComponentLink2Description: Datasheet; ComponentLink2URL: http://d2a072wq521u33.cloudfront.net/catalog_english//TW_TH.PDF; ComponentLink3Description: Package Specification; ComponentLink3URL: http://www.samtec.com/documents/webfiles/cpdf/TW-XX-XX-X-X-XXX-XXX-XXX-XX-MKT2.pdf
footprint SMTC-TW-02-03-X-D-200-080 (Terminal Strip, 2x2 Pins, Vertical, 2mm Pitch, Male)
pins: 1, 2, 3, 4

## TW-02-03-T-S-360-100
designator P?
Through-Hole Board Stacker, Vertical, -55 to 105 degC, 2 mm Pitch, 2-Pin, Male, RoHS; Manufacturer: Samtec; PartNumber: TW-02-03-T-S-360-100; Pitch: 2 mm; DatasheetVersion: F-214; PackageVersion: BF, 6/1998; PackageReference: TW-02-03-X-S-360-100; PackageDescription: High Temp 2mm Terminal Strip(Board Stacking); Orientation: Vertical; RoHS: True; Temperature Range: -55 to 105 degC; Mounting Technology: Through-hole; ComponentLink1Description: Manufacturer URL; ComponentLink1URL: http://www.samtec.com; ComponentLink2Description: Datasheet; ComponentLink2URL: http://d2a072wq521u33.cloudfront.net/catalog_english//TW_TH.PDF; ComponentLink3Description: Package Specification; ComponentLink3URL: http://www.samtec.com/documents/webfiles/cpdf/TW-XX-XX-X-X-XXX-XXX-XXX-XX-MKT2.pdf
footprint SMTC-TW-02-03-X-S-360-100 (Terminal Strip, 1x2 Pins, Vertical, 2mm Pitch, Male)
pins: 1, 2

## TW-02-04-F-D-330-SM
designator P?
SMT Board Stacker, Vertical, -55 to 125 degC, 2 mm Pitch, 4-Pin, Male, RoHS; Manufacturer: Samtec; PartNumber: TW-02-04-F-D-330-SM; Pitch: 2 mm; DatasheetVersion: F-214; PackageVersion: CL, 3/1993; PackageReference: TW-02-04-X-D-330-SM; PackageDescription: High Temp 2mm SMT Board Stacking Terminal Strip ASM; Orientation: Vertical; RoHS: True; Temperature Range: -55 to 125 degC; Mounting Technology: Surface Mount; ComponentLink1Description: Manufacturer URL; ComponentLink1URL: http://www.samtec.com; ComponentLink2Description: Datasheet; ComponentLink2URL: http://d2a072wq521u33.cloudfront.net/catalog_english//TW_SM.PDF; ComponentLink3Description: Package Specification; ComponentLink3URL: http://www.samtec.com/documents/webfiles/cpdf/TW-XX-XX-XXX-X-XXX-SM-XXX-XX-MKT1.pdf
footprint SMTC-TW-02-04-X-D-330-SM (SMT Board Stacking Terminal Strip ASM, 2x2 Pins, Vertical, 2mm Pitch, Male)
pins: 1, 2, 3, 4

## TW-02-04-L-D-330-SM
designator P?
SMT Board Stacker, Vertical, -55 to 125 degC, 2 mm Pitch, 4-Pin, Male, RoHS; Manufacturer: Samtec; PartNumber: TW-02-04-L-D-330-SM; Pitch: 2 mm; DatasheetVersion: F-214; PackageVersion: CL, 3/1993; PackageReference: TW-02-04-X-D-330-SM; PackageDescription: High Temp 2mm SMT Board Stacking Terminal Strip ASM; Orientation: Vertical; RoHS: True; Temperature Range: -55 to 125 degC; Mounting Technology: Surface Mount; ComponentLink1Description: Manufacturer URL; ComponentLink1URL: http://www.samtec.com; ComponentLink2Description: Datasheet; ComponentLink2URL: http://d2a072wq521u33.cloudfront.net/catalog_english//TW_SM.PDF; ComponentLink3Description: Package Specification; ComponentLink3URL: http://www.samtec.com/documents/webfiles/cpdf/TW-XX-XX-XXX-X-XXX-SM-XXX-XX-MKT1.pdf
footprint SMTC-TW-02-04-X-D-330-SM (SMT Board Stacking Terminal Strip ASM, 2x2 Pins, Vertical, 2mm Pitch, Male)
pins: 1, 2, 3, 4

## TW-02-04-T-D-330-SM
designator P?
SMT Board Stacker, Vertical, -55 to 105 degC, 2 mm Pitch, 4-Pin, Male, RoHS; Manufacturer: Samtec; PartNumber: TW-02-04-T-D-330-SM; Pitch: 2 mm; DatasheetVersion: F-214; PackageVersion: CL, 3/1993; PackageReference: TW-02-04-X-D-330-SM; PackageDescription: High Temp 2mm SMT Board Stacking Terminal Strip ASM; Orientation: Vertical; RoHS: True; Temperature Range: -55 to 105 degC; Mounting Technology: Surface Mount; ComponentLink1Description: Manufacturer URL; ComponentLink1URL: http://www.samtec.com; ComponentLink2Description: Datasheet; ComponentLink2URL: http://d2a072wq521u33.cloudfront.net/catalog_english//TW_SM.PDF; ComponentLink3Description: Package Specification; ComponentLink3URL: http://www.samtec.com/documents/webfiles/cpdf/TW-XX-XX-XXX-X-XXX-SM-XXX-XX-MKT1.pdf
footprint SMTC-TW-02-04-X-D-330-SM (SMT Board Stacking Terminal Strip ASM, 2x2 Pins, Vertical, 2mm Pitch, Male)
pins: 1, 2, 3, 4

## TW-02-09-F-D-205-SM-A
designator P?
SMT Board Stacker, Vertical, -55 to 125 degC, 2 mm Pitch, 4-Pin, Male, RoHS; Manufacturer: Samtec; PartNumber: TW-02-09-F-D-205-SM-A; Pitch: 2 mm; DatasheetVersion: F-214; PackageVersion: CL, 3/1993; PackageReference: TW-02-09-X-D-205-SM-A; PackageDescription: High Temp 2mm SMT Board Stacking Terminal Strip ASM; Orientation: Vertical; RoHS: True; Temperature Range: -55 to 125 degC; Mounting Technology: Surface Mount; ComponentLink1Description: Manufacturer URL; ComponentLink1URL: http://www.samtec.com; ComponentLink2Description: Datasheet; ComponentLink2URL: http://d2a072wq521u33.cloudfront.net/catalog_english//TW_SM.PDF; ComponentLink3Description: Package Specification; ComponentLink3URL: http://www.samtec.com/documents/webfiles/cpdf/TW-XX-XX-XXX-X-XXX-SM-XXX-XX-MKT1.pdf
footprint SMTC-TW-02-09-X-D-205-SM-A (SMT Board Stacking Terminal Strip ASM, 2x2 Pins, Vertical, 2mm Pitch, Male)
pins: 1, 2, 3, 4

## TW-02-09-F-S-200-SM
designator P?